# Altium footprint library ParsaLibrary.PcbLib: 526 footprints (part 29 of 33)
Each footprint in its own frame and in the unit in brackets; x right, y up, seen from the top. Pads: shape width x height; smd on the part's side, far side on the other; paste and mask are expansions set on the pad; w line width, h text height; cw(c..) or ccw(c..) is an arc to the next point about the centre after c.
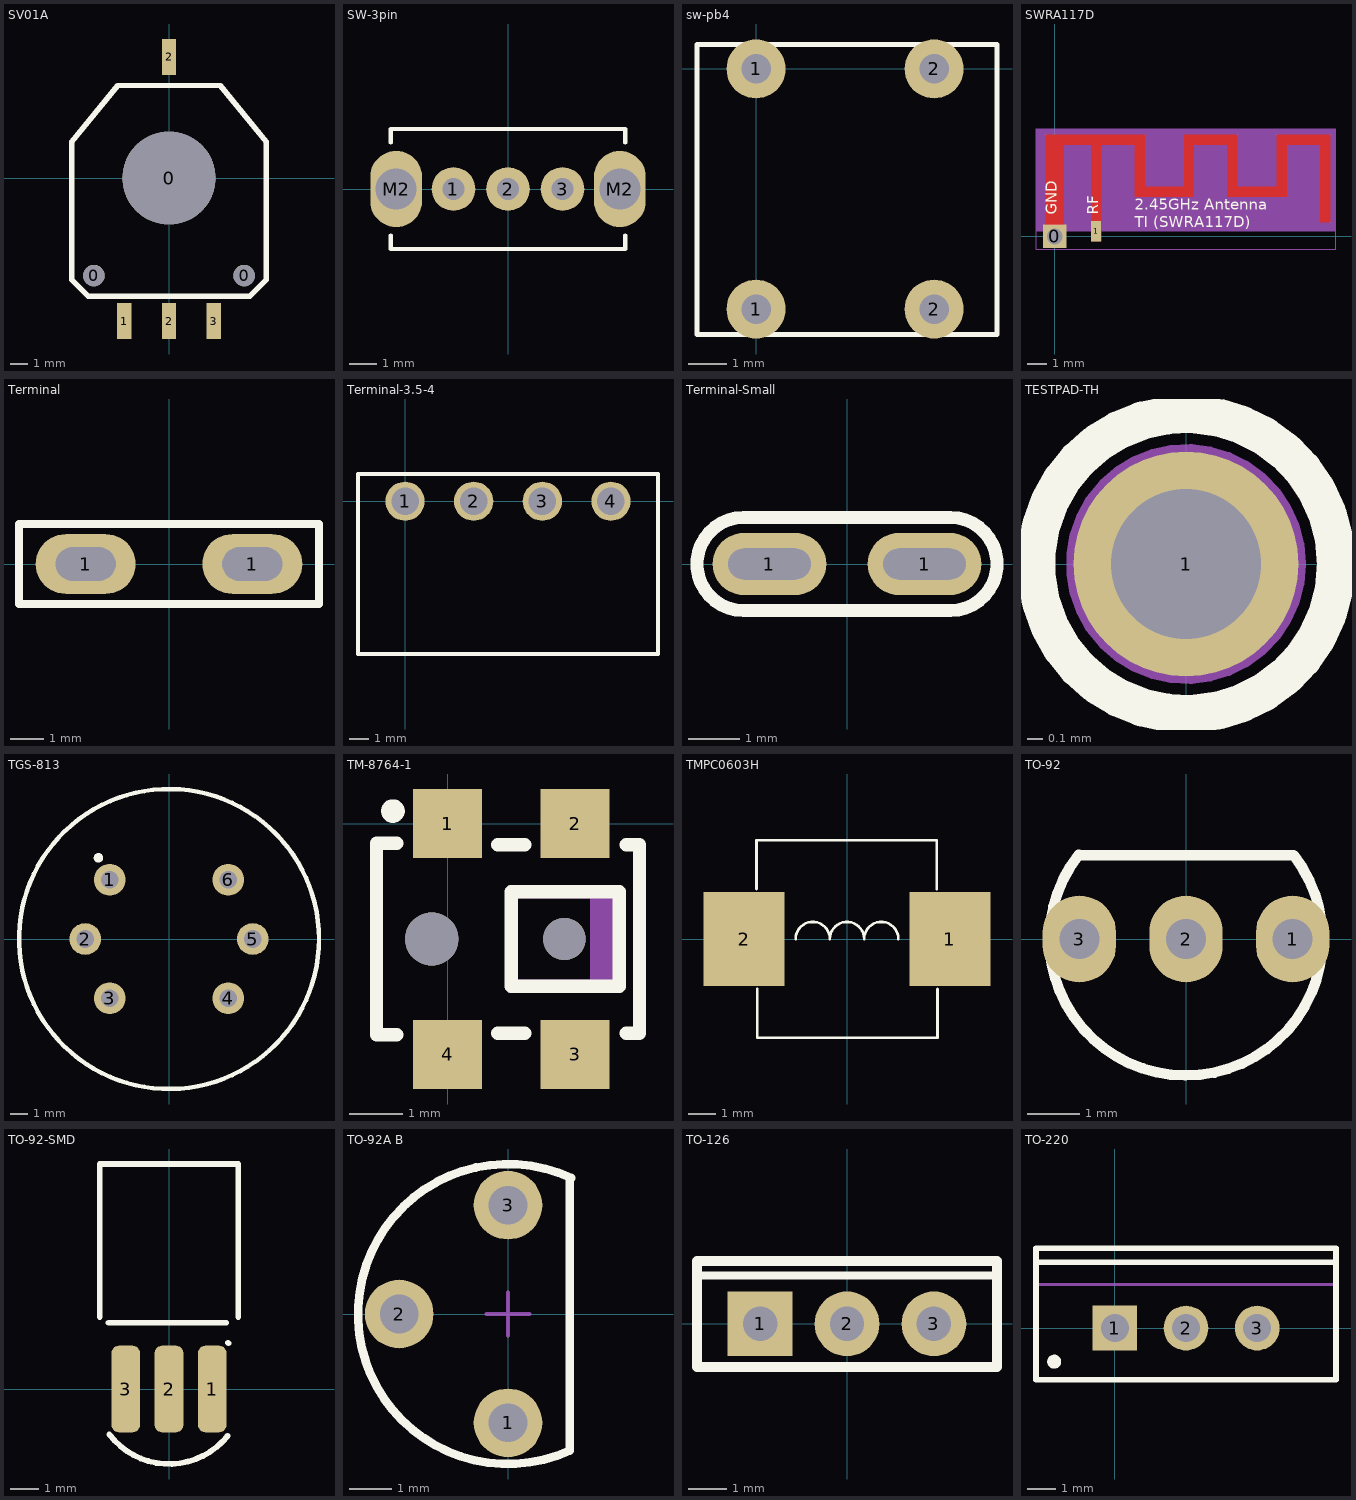
[diagram p28: the footprints below, top view; thin cyan lines are the x and y axes]

## SV01A [mm]
pads (7):
  round 1.2 hole 1.2: 0(-4.2,-5.45) 0(4.2,-5.45)
  round 5.2 hole 5.2: 0(0,0)
  rect 0.8x2 smd: 1(-2.5,-8) 2(0,-8) 2(0,6.782) 3(2.5,-8)
Top Overlay:
  lines w0.3: -5.436,-5.69 -5.436,2.032 -2.87,5.182 0.584,5.182 2.87,5.182 5.436,2.032 5.436,-5.69 4.521,-6.604 3.048,-6.604 -4.521,-6.604 -5.436,-5.69
3D body "User Library-SV01A_smd.x_b": height 2.15, standoff -0.99, extent -5.436,-8.161 5.564,6.739

## SW-3pin [mm]
pads (5):
  round 1.6 hole 0.8: 1(-2,0) 2(0,0) 3(2,0)
  oval 1.9x2.8 hole 1.5: M2(-4.1,0) M2(4.1,0)
Top Overlay:
  lines w0.15: -4.3,-1.7 -4.3,-2.2 4.3,-2.2 4.3,-1.7 ; -4.3,1.7 -4.3,2.2 4.3,2.2 4.3,1.7
3D body "switch.step": height 8.74, standoff -2.74, extent -4.305,-2.194 4.305,2.2

## sw-pb4 [mil]
pads (4):
  round 60 hole 30: 1(0,-244.09) 1(0,0) 2(181.1,-244.09) 2(181.1,0)
Top Overlay:
  lines w5: -60,-270 -60,25 245,25 245,-270 -60,-270
3D body "tactileswitch-short.STEP": height 195, standoff -133, extent -60.4,-253.5 242.4,-17

## SWRA117D [mil] "2.45GHz Antenna"
pads (2):
  rect 47.25x47.25 hole 31.5: 0(0,0)
  rect 20x40 smd: 1(82.67,10.24)
Top Layer:
  region: -17.72,-9.84 -17.72,202.76 179.13,202.76 179.13,98.82 257.87,98.82 257.87,202.76 364.17,202.76 364.17,98.82 442.91,98.82 442.91,202.76 549.21,202.76 549.21,27.96 529.52,27.96 529.52,183.07 462.6,183.07 462.6,79.14 344.48,79.14 344.48,183.07 277.56,183.07 277.56,79.14 159.45,79.14 159.45,183.07 92.52,183.07 92.52,-9.84 72.83,-9.84 72.83,183.07 17.71,183.07 17.71,-9.84
Top Overlay:
  text "TI (SWRA117D)" at 159.45,9.85 h37.2
  text "GND" at 11.81,43.31 h37.2
  text "RF" at 94.48,43.31 h37.2
  text "2.45GHz Antenna" at 159.45,45.28 h37.2
Mechanical 1:
  lines w0: -37.41,-25.59 -37.41,214.57 561.02,214.57 561.02,-25.59 -37.41,-25.59
Mechanical 27:
  rectangle: -37.41,9.85 561.02,214.57
Mechanical 28:
  rectangle: -37.41,9.85 561.02,214.57

## Terminal [mm]
height 10
pads (2):
  oval 3x1.8 hole 1 slot 1.8 at 0 deg: 1(-2.5,0) 1(2.5,0)
Top Overlay:
  lines w0.254: -4.5,-1.2 -4.5,1.2 4.5,1.2 4.5,-1.2 -4.5,-1.2

## Terminal-3.5-4 [mm]
pads (4):
  round 2 hole 1.4: 1(0,0) 2(3.5,0) 3(7,0) 4(10.5,0)
Top Overlay:
  lines w0.2: -2.4,-7.8 -2.4,1.4 12.9,1.4 12.9,-7.8 -2.4,-7.8

## Terminal-Small [mm]
pads (2):
  oval 2.2x1.2 hole 0.6 slot 1.6 at 0 deg: 1(-1.5,0) 1(1.5,0)
Top Overlay:
  lines w0.254: -2,-0.9 cw(c-2,0) -2,0.9 2,0.9 cw(c2,0) 2,-0.9 -2,-0.9

## TESTPAD-TH [mm]
pads (1):
  round 1.5 hole 1: 1(0,0)
Top Overlay:
  circle w0.254: c0,0 r1
Mechanical 7:
  circle w0.1: c0,0 r0.5
  circle w0.1: c0,0 r0.75
  circle w0.1: c0,0 r1
  text ".Designator" at -0.5,1.15 h0.38

## TGS-813 [mm]
pads (6):
  round 1.8 hole 1: 1(-3.359,3.359) 2(-4.75,0) 3(-3.359,-3.359) 4(3.359,-3.359) 5(4.75,0) 6(3.359,3.359)
Top Overlay:
  circle w0.254: c-4,4.6 r0.141
  circle w0.254: c0,0 r8.5

## TM-8764-1 [mm] "SW-SMD"
pads (6):
  rect 1.3x1.3 smd paste+0 mask+0.051: 1(0,0) 2(2.4,0) 3(2.4,-4.35) 4(0,-4.35)
  round 1 hole 1 unplated paste-2539.97: ""(-0.3,-2.175)
  round 0.8 hole 0.8 unplated paste-2539.97: ""(2.2,-2.175)
Top Overlay:
  circle w0.254: c-1.03,0.235 r0.095
  lines w0.254: -0.959,-3.975 -1.34,-3.975 -1.34,-0.375 -0.959,-0.375 ; 0.946,-3.953 1.454,-3.953 ; 0.946,-0.397 1.454,-0.397 ; 3.359,-3.953 3.613,-3.953 3.613,-0.397 3.359,-0.397 ; 1.2,-3.064 3.232,-3.064 3.232,-1.286 1.2,-1.286 1.2,-3.064
Mechanical 15:
  circle w0.45: c-0.3,-2.175 r0.225
  circle w0.35: c2.2,-2.175 r0.175
  region: 1.08,-1.405 1.08,-3.105 1.16,-3.185 3.27,-3.185 3.35,-3.105 3.35,-1.255 3.26,-1.165 1.34,-1.165 1.34,-1.405 3.11,-1.405 3.11,-2.945 1.32,-2.945 1.32,-1.165 1.16,-1.165 1.08,-1.245
  region: 2.69,-1.405 2.69,-2.945 3.11,-2.945 3.11,-1.455 3.17,-1.395
3D body "b.stp": height 3.5, standoff -0.59, extent -1.212,-4.734 3.512,0.384

## TMPC0603H [mm] "INDUCTOR"
pads (2):
  rect 3x3.5 smd: 1(3.81,0) 2(-3.81,0)
Top Overlay:
  lines w0.1: -3.353,1.854 -3.353,3.658 3.327,3.658 3.327,1.854 ; -3.327,-1.854 -3.327,-3.658 3.353,-3.658 3.353,-1.854 ; -1.905,0 cw(c-1.27,0) -0.635,0 cw(c0,0) 0.635,0 cw(c1.27,0) 1.905,0
3D body "User Library-L_ShouHan_CYA0630.x_t": height 3, standoff 0, extent -3.3,-3.6 3.3,3.6

## TO-92 [mil]
pads (3):
  oval 55x65 hole 30: 1(80,0) 2(0,0) 3(-80,0)
Top Overlay:
  lines w7.87: -80.54,63.17 ccw(c0,0) 81.13,62.41 80.55,62.99 -80.31,62.99
3D body "SW3dPS-TO-92A.STEP": height 314.96, standoff -118.11, extent -97.49,-90.72 91.49,64

## TO-92-SMD [mm]
pads (3):
  rrect50% 1x3 smd: 1(1.5,0) 2(0,0) 3(-1.5,0)
Top Overlay:
  lines w0.2: -2.4,2.5 -2.4,7.8 2.4,7.8 2.4,2.5 ; -2.1,2.3 1.986,2.3 ; -2.068,-1.576 ccw(c0,0) 2.03,-1.624 ; 2.046,1.6 2.061,1.585
3D body "SW3dPS-TO-92A.STEP": height 2.4, standoff -1.53, extent -2.4,-3.2 2.4,7.8

## TO-92A B [mm]
pads (3):
  round 1.6 hole 0.9: 1(0,-2.54) 2(-2.54,0) 3(0,2.54)
Top Overlay:
  lines w0.2: 1.442,3.104 1.442,-3.189 cw(c0,0) 1.475,3.174
Mechanical 15:
  lines w0.1: -0.5,0 0.5,0 ; 0,-0.5 0,0.5

## TO-126 [mm]
pads (3):
  rect 1.7x1.7 hole 0.9: 1(-2.28,0)
  round 1.7 hole 0.9: 2(0,0) 3(2.28,0)
Top Overlay:
  lines w0.2: -3.937,1.27 3.937,1.27
  lines w0.254: -3.937,1.207 -3.937,-1.135 3.936,-1.135 3.936,1.206 ; -3.937,1.27 -3.937,1.651 3.937,1.651 3.937,1.27
3D body "User Library-TO-126 (SOT32) Gold PCB.step": height 13.19, standoff -3.54, extent -3.8,-1 3.8,1.55

## TO-220 [mm]
pads (3):
  rect 1.6x1.6 hole 1: 1(0,0)
  round 1.6 hole 1: 2(2.54,0) 3(5.08,0)
Top Overlay:
  circle w0.25: c-2.16,-1.2 r0.125
  lines w0.2: -2.81,2.35 7.89,2.35 ; -2.81,-1.85 7.89,-1.85 7.89,2.85 -2.81,2.85 -2.81,-1.85
Mechanical 13:
  lines w0.1: -2.81,1.55 7.89,1.55 ; -2.81,-1.85 -2.81,2.85 7.89,2.85 7.89,-1.85 -2.81,-1.85
Mechanical 15:
  lines w0.1: 2.04,0 3.04,0 ; 2.54,-0.5 2.54,0.5
3D body "User Library-TO-220-4.STEP": height 20.06, standoff -8.74, extent -2.56,-1.833 7.64,2.667